# Altium footprint library UWRT_Footprint_Library_2020.PcbLib: 376 footprints (part 18 of 24)
Each footprint in its own frame and in the unit in brackets; x right, y up, seen from the top. Pads: shape width x height; smd on the part's side, far side on the other; paste and mask are expansions set on the pad; w line width, h text height; cw(c..) or ccw(c..) is an arc to the next point about the centre after c.
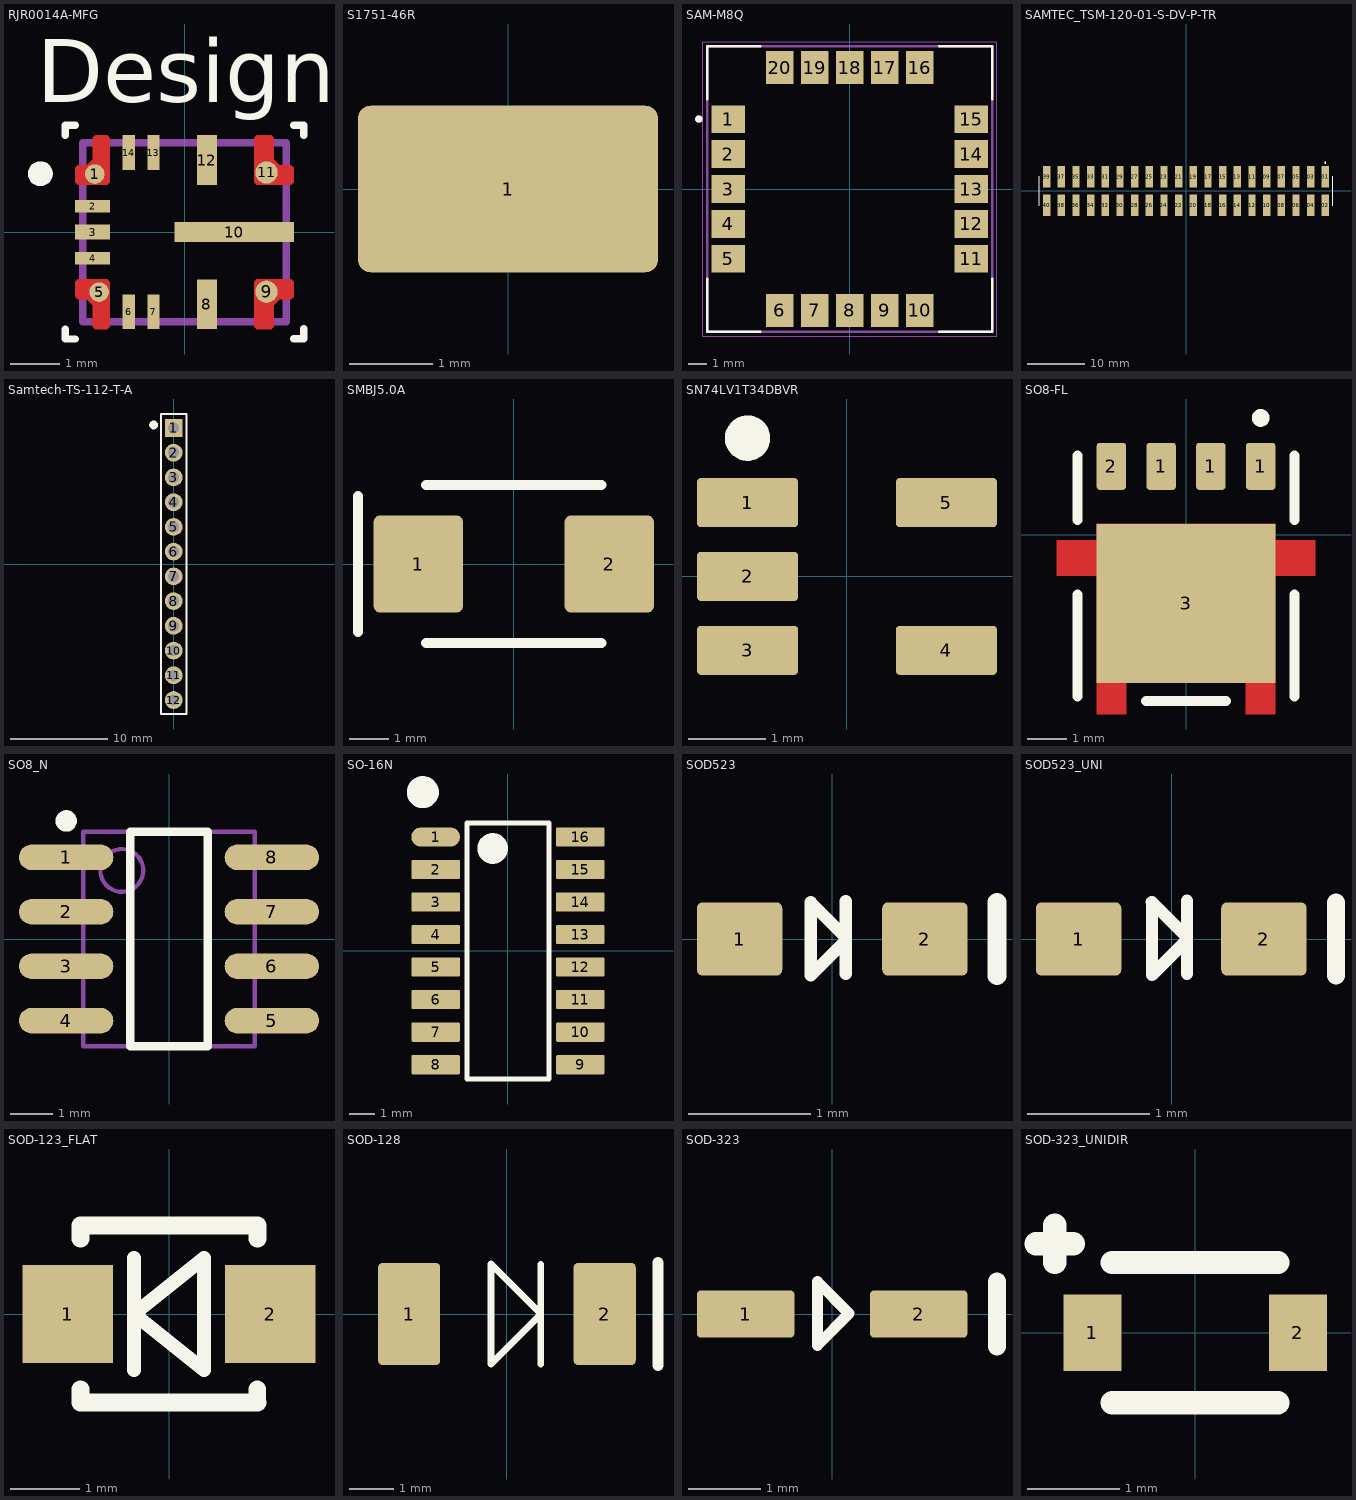
[diagram p17: the footprints below, top view; thin cyan lines are the x and y axes]

## RJR0014A-MFG [mm]
pads (14):
  round 0.394 smd paste-0.184 mask+0: 1(-1.806,1.169) 5(-1.719,-1.206)
  rect 0.7x0.25 smd paste+0 mask+0: 2(-1.85,0.525) 4(-1.85,-0.525)
  rect 0.7x0.3 smd paste+0 mask+0: 3(-1.85,0)
  rect 0.25x0.7 smd paste+0 mask+0: 6(-1.125,-1.6) 7(-0.625,-1.6) 13(-0.625,1.6) 14(-1.125,1.6)
  rect 0.4x1 smd paste+0 mask+0: 8(0.45,-1.45) 12(0.45,1.45)
  round 0.45 smd paste-0.212 mask+0: 9(1.65,-1.2) 11(1.65,1.2)
  rect 2.4x0.4 smd paste-1.187 mask+0: 10(1,0)
Top Layer:
  region: 1.45,-1.95 1.75,-1.95 1.8,-1.9 1.8,-1.47 1.92,-1.35 2.15,-1.35 2.2,-1.3 2.2,-1 2.15,-0.95 1.45,-0.95 1.4,-1 1.4,-1.9
  region: 1.45,1.95 1.75,1.95 1.8,1.9 1.8,1.47 1.92,1.35 2.15,1.35 2.2,1.3 2.2,1 2.15,0.95 1.45,0.95 1.4,1 1.4,1.9
  region: -1.8,-1.95 -1.55,-1.95 -1.5,-1.9 -1.5,-1 -1.55,-0.95 -2.15,-0.95 -2.2,-1 -2.2,-1.3 -2.15,-1.35 -1.97,-1.35 -1.85,-1.47 -1.85,-1.9
  region: -1.8,1.95 -1.55,1.95 -1.5,1.9 -1.5,1 -1.55,0.95 -2.15,0.95 -2.2,1 -2.2,1.3 -2.15,1.35 -1.97,1.35 -1.85,1.47 -1.85,1.9
Top Overlay:
  circle w0.25: c-2.9,1.175 r0.125
  lines w0.15: -2.399,-1.95 -2.399,-2.15 -2.199,-2.15 ; -2.399,1.948 -2.399,2.148 -2.199,2.148 ; 2.2,-2.148 2.4,-2.148 2.4,-1.948 ; 2.199,2.149 2.399,2.149 2.399,1.949
  text "Designator10" at -2.972,2.616 h1.27
Top Paste:
  region: 1.1,-0.15 1.1,0.15 1.15,0.2 2.15,0.2 2.2,0.15 2.2,-0.15 2.15,-0.2 1.15,-0.2
  region: 0.9,-0.15 0.85,-0.2 -0.15,-0.2 -0.2,-0.15 -0.2,0.15 -0.15,0.2 0.85,0.2 0.9,0.15
  region: 1.45,-1.95 1.7,-1.95 1.75,-1.9 1.75,-1.47 1.92,-1.3 2.15,-1.3 2.2,-1.25 2.2,-1 2.15,-0.95 1.45,-0.95 1.4,-1 1.4,-1.9
  region: 1.45,1.95 1.7,1.95 1.75,1.9 1.75,1.47 1.92,1.3 2.15,1.3 2.2,1.25 2.2,1 2.15,0.95 1.45,0.95 1.4,1 1.4,1.9
  region: -1.75,-1.95 -1.55,-1.95 -1.5,-1.9 -1.5,-1 -1.55,-0.95 -2.15,-0.95 -2.2,-1 -2.2,-1.25 -2.15,-1.3 -1.97,-1.3 -1.8,-1.47 -1.8,-1.9
  region: -1.75,1.95 -1.55,1.95 -1.5,1.9 -1.5,1 -1.55,0.95 -2.15,0.95 -2.2,1 -2.2,1.25 -2.15,1.3 -1.97,1.3 -1.8,1.47 -1.8,1.9
Top Solder:
  region: 1.75,-1.95 1.45,-1.95 1.4,-1.9 1.4,-1 1.45,-0.95 2.15,-0.95 2.2,-1 2.2,-1.3 2.15,-1.35 1.92,-1.35 1.8,-1.47 1.8,-1.9
  region: 1.45,1.95 1.75,1.95 1.8,1.9 1.8,1.47 1.92,1.35 2.15,1.35 2.2,1.3 2.2,1 2.15,0.95 1.45,0.95 1.4,1 1.4,1.9
  region: -1.5,-1.9 -1.55,-1.95 -1.8,-1.95 -1.85,-1.9 -1.85,-1.47 -1.97,-1.35 -2.15,-1.35 -2.2,-1.3 -2.2,-1 -2.15,-0.95 -1.55,-0.95 -1.5,-1
  region: -1.8,1.95 -1.55,1.95 -1.5,1.9 -1.5,1 -1.55,0.95 -2.15,0.95 -2.2,1 -2.2,1.3 -2.15,1.35 -1.97,1.35 -1.85,1.47 -1.85,1.9
Mechanical 13:
  lines w0.15: -2.05,-1.8 -2.05,1.8 2.05,1.8 2.05,-1.8 -2.05,-1.8

## S1751-46R [mm] "SMD LOOP TESTPOINT"
height 2
pads (1):
  rrect15% 3.6x2 smd: 1(0,0)
3D body "s1751-46r.stp": height 2.01, standoff -0.04, extent -1.625,-0.85 1.625,0.8

## SAM-M8Q [mm]
pads (20):
  rect 1.8x1.5 smd paste-2: 1(-6.6,3.8) 2(-6.6,1.9) 3(-6.6,0) 4(-6.6,-1.9) 5(-6.6,-3.8) 11(6.6,-3.8) 12(6.6,-1.9) 13(6.6,0) 14(6.6,1.9) 15(6.6,3.8)
  rect 1.5x1.8 smd paste-2: 6(-3.8,-6.6) 7(-1.9,-6.6) 8(0,-6.6) 9(1.9,-6.6) 10(3.8,-6.6) 16(3.8,6.6) 17(1.9,6.6) 18(0,6.6) 19(-1.9,6.6) 20(-3.8,6.6)
Top Overlay:
  circle w0.2: c-8.2,3.8 r0.1
  lines w0.127: -7.75,-4.87 -7.75,-7.75 -4.87,-7.75 ; -7.75,4.87 -7.75,7.75 -4.87,7.75 ; 4.87,-7.75 7.75,-7.75 7.75,-4.87 ; 4.87,7.75 7.75,7.75 7.75,4.87
Top Paste:
  drawing of 80 lines, arcs and shapes, not listed
Mechanical 13:
  circle w0.2: c-8.2,3.8 r0.1
  lines w0.127: -7.75,-7.75 7.75,-7.75 7.75,7.75 -7.75,7.75 -7.75,-7.75
Mechanical 15:
  lines w0.05: -8,-8 -8,8 8,8 8,-8 -8,-8
3D body "SAM_AP214.STEP": height 6.38, standoff 0, extent -7.738,-7.723 7.763,7.778

## SAMTEC_TSM-120-01-S-DV-P-TR [mm]
pads (40):
  rect 1.27x3.68 smd: 01(24.13,2.475) 02(24.13,-2.475) 03(21.59,2.475) 04(21.59,-2.475) 05(19.05,2.475) 06(19.05,-2.475) 07(16.51,2.475) 08(16.51,-2.475) 09(13.97,2.475) 10(13.97,-2.475) 11(11.43,2.475) 12(11.43,-2.475) 13(8.89,2.475) 14(8.89,-2.475) 15(6.35,2.475) 16(6.35,-2.475) 17(3.81,2.475) 18(3.81,-2.475) 19(1.27,2.475) 20(1.27,-2.475) 21(-1.27,2.475) 22(-1.27,-2.475) 23(-3.81,2.475) 24(-3.81,-2.475) 25(-6.35,2.475) 26(-6.35,-2.475) 27(-8.89,2.475) 28(-8.89,-2.475) 29(-11.43,2.475) 30(-11.43,-2.475) 31(-13.97,2.475) 32(-13.97,-2.475) 33(-16.51,2.475) 34(-16.51,-2.475) 35(-19.05,2.475) 36(-19.05,-2.475) 37(-21.59,2.475) 38(-21.59,-2.475) 39(-24.13,2.475) 40(-24.13,-2.475)
Top Overlay:
  circle w0.2: c24.13,4.9 r0.1
  lines w0.2: -25.4,-2.54 -25.4,2.54 ; 25.4,-2.54 25.4,2.54

## Samtech-TS-112-T-A [mil] "Samtech CONN HEADER VERT 12POS 2.54MM"
pads (12):
  rect 71.93x71.93 hole 45: 1(0,550)
  round 71.93 hole 45: 2(0,450) 3(0,350) 4(0,250) 5(0,150) 6(0,50) 7(0,-50) 8(0,-150) 9(0,-250) 10(0,-350) 11(0,-450) 12(0,-550)
Top Overlay:
  circle w19.68: c-81,562 r7.87
  lines w7.87: -51.18,-606.3 51.18,-606.3 51.18,606.3 -51.18,606.3 -51.18,-606.3
3D body "TS-112-T-A.stp": height 326, standoff -151, extent -50,-604 50,604

## SMBJ5.0A [mm] "9.2V Clamp 65.3A Ipp Tvs Diode Surface Mount SMB (DO-214AA)"
height 2.62
pads (2):
  rrect15% 2.3x2.5 smd: 1(-2.45,0) 2(2.45,0)
Top Overlay:
  lines w0.254: -4,-1.75 -4,1.75 ; -2.25,-2.032 2.25,-2.032 ; -2.25,2.032 2.25,2.032
3D body "User Library-DO-214AA SMB.STEP": height 2.27, standoff -0.03, extent -2.7,-1.8 2.7,1.8

## SN74LV1T34DBVR [mm] "SOT-23-5, Unidirectional level shifter"
height 1.45
pads (5):
  rrect15% 1.3x0.63 smd mask+0.05: 1(-1.279,0.95) 2(-1.279,0) 3(-1.279,-0.95) 4(1.279,-0.95) 5(1.279,0.95)
Top Overlay:
  circle w0.3: c-1.279,1.778 r0.141
3D body "SN74AHC1G02DBVT.stp": height 1.2, standoff 0, extent -1.4,-1.45 1.4,1.45

## SO8-FL [mm]
pads (5):
  rrect20% 0.75x1.2 smd: 1(-0.635,1.75) 1(0.635,1.75) 1(1.905,1.75) 2(-1.905,1.75)
  rect 4.56x4.055 smd mask+0: 3(0,-1.75)
Top Layer:
  region: -2.28,0.285 -2.28,-0.14 -3.302,-0.14 -3.302,-1.045 -2.28,-1.045 -2.28,-4.572 -1.53,-4.572 -1.53,-3.77 1.53,-3.77 1.53,-4.572 2.28,-4.572 2.28,-1.045 3.302,-1.045 3.302,-0.14 2.28,-0.14 2.28,0.285
  region: 1.3,-4.415
Top Overlay:
  circle w0.254: c1.905,2.985 r0.1
  lines w0.254: -2.775,-4.12 -2.775,-1.524 ; -2.775,0.381 -2.775,2.03 ; -1.016,-4.245 1.016,-4.245 ; 2.775,-4.12 2.775,-1.524 ; 2.775,0.381 2.775,2.03
3D body "User Library-DFN5x6_SO8FL.STEP": height 1.13, standoff 0, extent -2.527,-4.12 2.622,2.03

## SO8_N [mm] "SOIC, 8-Leads, Body 4.9x3.9mm, Pitch 1.27mm, IPC Medium Density"
height 1.75
pads (8):
  oval 2.2x0.6 smd: 1(-2.4,1.905) 2(-2.4,0.635) 3(-2.4,-0.635) 4(-2.4,-1.905) 5(2.4,-1.905) 6(2.4,-0.635) 7(2.4,0.635) 8(2.4,1.905)
Top Overlay:
  circle w0.25: c-2.4,2.755 r0.125
  lines w0.2: -0.9,-2.5 -0.9,2.5 0.9,2.5 0.9,-2.5 -0.9,-2.5
Mechanical 13:
  circle w0.1: c-1.1,1.6 r0.5
  lines w0.1: -2,-2.5 -2,2.5 2,2.5 2,-2.5 -2,-2.5
3D body: height 1.75, standoff 0, extent -2,-2.5 2,2.5

## SO-16N [mm]
pads (16):
  oval 1.9x0.75 smd: 1(-2.825,4.445)
  rrect15% 1.9x0.75 smd: 2(-2.825,3.175) 3(-2.825,1.905) 4(-2.825,0.635) 5(-2.825,-0.635) 6(-2.825,-1.905) 7(-2.825,-3.175) 8(-2.825,-4.445) 9(2.825,-4.445) 10(2.825,-3.175) 11(2.825,-1.905) 12(2.825,-0.635) 13(2.825,0.635) 14(2.825,1.905) 15(2.825,3.175) 16(2.825,4.445)
Top Overlay:
  circle w0.6: c-0.6,4 r0.3
  circle w1: c-3.327,6.198 r0.125
  lines w0.2: -1.6,-5 1.6,-5 1.6,5 -1.6,5 -1.6,-5
3D body "SOIC127P600X175-16M.step": height 1.75, standoff 0, extent -3,-5 3,5

## SOD523 [mm] "ESD5Z3.3T1G"
pads (2):
  rrect15% 0.7x0.6 smd: 1(-0.76,0) 2(0.76,0)
Top Overlay:
  lines w0.102: -0.178,0.302 0.11,0.015 ; -0.176,0.3 -0.176,-0.297 0.111,-0.01 ; 0.111,-0.286 0.111,0.311
  lines w0.152: 1.352,-0.3 1.352,0.3
3D body "User Library-SOD-523F.STEP": height 0.7, standoff 0, extent -0.798,-0.399 0.802,0.399

## SOD523_UNI [mm]
pads (2):
  rrect15% 0.7x0.6 smd: 1(-0.762,0) 2(0.758,0)
Top Overlay:
  lines w0.102: -0.162,0.303 0.125,0.016 ; -0.16,0.302 -0.16,-0.295 0.127,-0.008 ; 0.127,-0.284 0.127,0.313
  lines w0.15: 1.35,-0.3 1.35,0.3
3D body "User Library-SOD-523F.STEP": height 0.7, standoff 0, extent -0.8,-0.399 0.8,0.399

## SOD-123_FLAT [mm]
pads (2):
  rect 1.3x1.4 smd: 1(-1.45,0) 2(1.45,0)
Top Overlay:
  lines w0.2: -0.5,-0.8 -0.5,0.8 ; -0.5,0 0.5,-0.8 0.5,0.8 -0.5,0
  lines w0.254: -1.27,-1.27 1.27,-1.27 ; -1.27,1.077 -1.27,1.27 1.27,1.27 1.27,1.077 ; -1.268,-1.27 -1.268,-1.077 ; 1.266,-1.27 1.266,-1.077
Top Paste:
  rectangle: 0.8,-0.7 2.1,0.7
  rectangle: -2.1,-0.7 -0.8,0.7
3D body "SOD-123FL.STEP": height 1.35, standoff 0, extent -1.925,-1.077 1.925,1.076

## SOD-128 [mm]
pads (2):
  rrect15% 1.4x2.3 smd: 1(-2.2,0) 2(2.2,0)
Top Overlay:
  lines w0.152: -0.358,-1.124 -0.358,1.123 0.764,0.001 ; -0.358,-1.123 0.764,-0.001 ; 0.764,-1.125 0.764,1.122
  lines w0.254: 3.4,-1.15 3.4,1.15
3D body "DIO_RB050LAM_ROM-L.step": height 1.05, standoff 0, extent -2.426,-1.245 2.426,1.245

## SOD-323 [mm]
pads (2):
  rrect15% 1.35x0.65 smd: 1(-1.2,0) 2(1.2,0)
Top Overlay:
  lines w0.152: -0.205,0.45 -0.205,-0.434 0.236,0.007 -0.2,0.444
  lines w0.254: 2.286,-0.45 2.286,0.45
3D body "CMDSH05-4 TR--3DModel-STEP-56544.STEP": height 1.1, standoff 0.01, extent -1.245,-0.622 1.245,0.622

## SOD-323_UNIDIR [mm]
pads (2):
  rect 0.63x0.83 smd: 1(-1.115,0) 2(1.115,0)
Top Overlay:
  lines w0.254: -1.727,0.965 -1.321,0.965 ; -1.524,0.762 -1.524,1.168 ; -0.9,-0.762 0.9,-0.762 ; -0.9,0.762 0.9,0.762
3D body "CMDSH05-4 TR--3DModel-STEP-56544.STEP": height 1.1, standoff 0.01, extent -1.245,-0.622 1.245,0.622